# Altium footprint library XU-GENARAL PCB .PcbLib: 1176 footprints (part 71 of 75)
Each footprint in its own frame and in the unit in brackets; x right, y up, seen from the top. Pads: shape width x height; smd on the part's side, far side on the other; paste and mask are expansions set on the pad; w line width, h text height; cw(c..) or ccw(c..) is an arc to the next point about the centre after c.
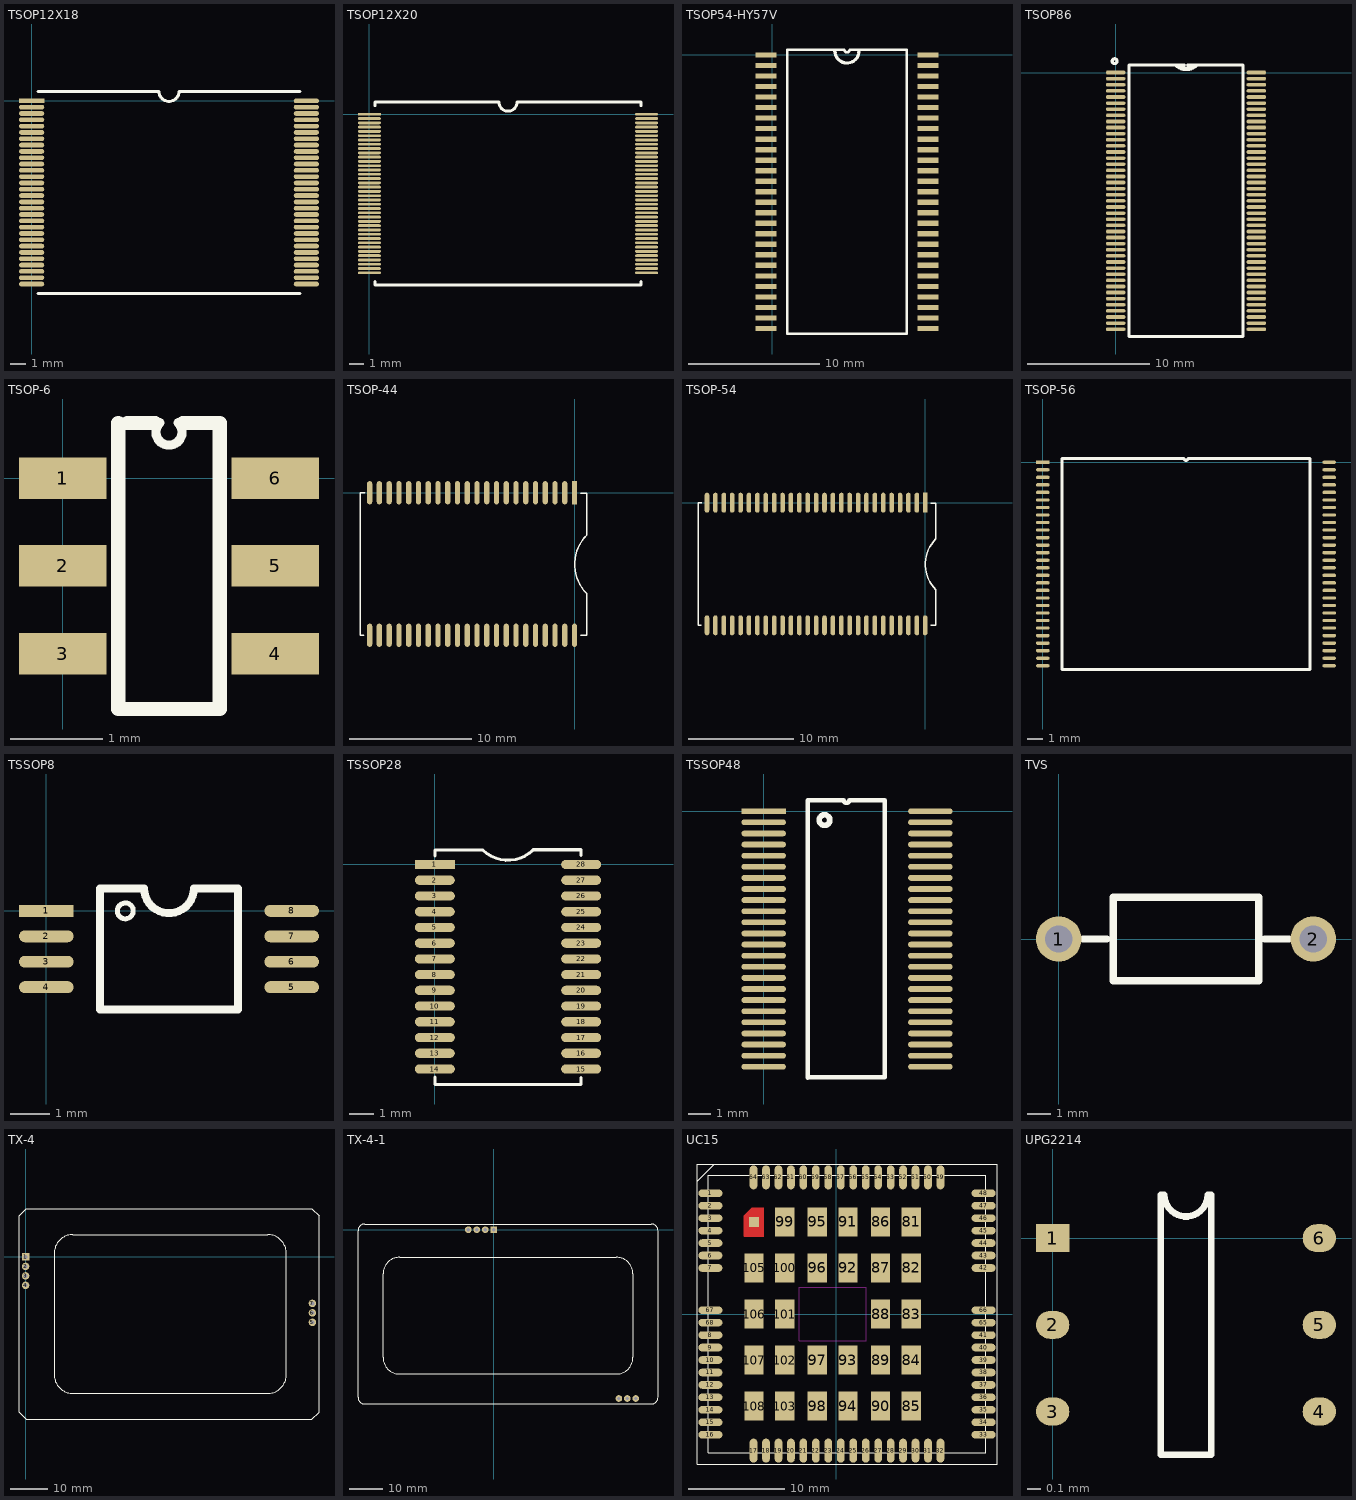
[diagram p70: the footprints below, top view; thin cyan lines are the x and y axes]

## TSOP12X18 [mm]
pads (60):
  rect 1.6x0.3 smd: 1(0,0)
  oval 1.6x0.3 smd: 2(0,-0.4) 3(0,-0.8) 4(0,-1.2) 5(0,-1.6) 6(0,-2) 7(0,-2.4) 8(0,-2.8) 9(0,-3.2) 10(0,-3.6) 11(0,-4) 12(0,-4.4) 13(0,-4.8) 14(0,-5.2) 15(0,-5.6) 16(0,-6) 17(0,-6.4) 18(0,-6.8) 19(0,-7.2) 20(0,-7.6) 21(0,-8) 22(0,-8.4) 23(0,-8.8) 24(0,-9.2) 25(0,-9.6) 26(0,-10) 27(0,-10.4) 28(0,-10.8) 29(0,-11.2) 30(0,-11.6) 31(17.4,-11.6) 32(17.4,-11.2) 33(17.4,-10.8) 34(17.4,-10.4) 35(17.4,-10) 36(17.4,-9.6) 37(17.4,-9.2) 38(17.4,-8.8) 39(17.4,-8.4) 40(17.4,-8) 41(17.4,-7.6) 42(17.4,-7.2) 43(17.4,-6.8) 44(17.4,-6.4) 45(17.4,-6) 46(17.4,-5.6) 47(17.4,-5.2) 48(17.4,-4.8) 49(17.4,-4.4) 50(17.4,-4) 51(17.4,-3.6) 52(17.4,-3.2) 53(17.4,-2.8) 54(17.4,-2.4) 55(17.4,-2) 56(17.4,-1.6) 57(17.4,-1.2) 58(17.4,-0.8) 59(17.4,-0.4) 60(17.4,0)
Top Overlay:
  lines w0.2: 0.4,-12.2 17,-12.2 ; 0.4,0.6 8.065,0.6 ccw(c8.7,0.6) 9.335,0.6 17,0.6

## TSOP12X20 [mm]
pads (76):
  rect 1.6x0.2 smd: 1(0,0)
  oval 1.6x0.2 smd: 2(0,-0.3) 3(0,-0.6) 4(0,-0.9) 5(0,-1.2) 6(0,-1.5) 7(0,-1.8) 8(0,-2.1) 9(0,-2.4) 10(0,-2.7) 11(0,-3) 12(0,-3.3) 13(0,-3.6) 14(0,-3.9) 15(0,-4.2) 16(0,-4.5) 17(0,-4.8) 18(0,-5.1) 19(0,-5.4) 20(0,-5.7) 21(0,-6) 22(0,-6.3) 23(0,-6.6) 24(0,-6.9) 25(0,-7.2) 26(0,-7.5) 27(0,-7.8) 28(0,-8.1) 29(0,-8.4) 30(0,-8.7) 31(0,-9) 32(0,-9.3) 33(0,-9.6) 34(0,-9.9) 35(0,-10.2) 36(0,-10.5) 37(0,-10.8) 38(0,-11.1) 39(19.4,-11.1) 40(19.4,-10.8) 41(19.4,-10.5) 42(19.4,-10.2) 43(19.4,-9.9) 44(19.4,-9.6) 45(19.4,-9.3) 46(19.4,-9) 47(19.4,-8.7) 48(19.4,-8.4) 49(19.4,-8.1) 50(19.4,-7.8) 51(19.4,-7.5) 52(19.4,-7.2) 53(19.4,-6.9) 54(19.4,-6.6) 55(19.4,-6.3) 56(19.4,-6) 57(19.4,-5.7) 58(19.4,-5.4) 59(19.4,-5.1) 60(19.4,-4.8) 61(19.4,-4.5) 62(19.4,-4.2) 63(19.4,-3.9) 64(19.4,-3.6) 65(19.4,-3.3) 66(19.4,-3) 67(19.4,-2.7) 68(19.4,-2.4) 69(19.4,-2.1) 70(19.4,-1.8) 71(19.4,-1.5) 72(19.4,-1.2) 73(19.4,-0.9) 74(19.4,-0.6) 75(19.4,-0.3) 76(19.4,0)
Top Overlay:
  lines w0.2: 0.4,-11.7 0.4,-11.95 19,-11.95 19,-11.7 ; 0.4,0.6 0.4,0.85 9.065,0.85 ccw(c9.7,0.85) 10.335,0.85 19,0.85 19,0.6

## TSOP54-HY57V [mm]
pads (54):
  rect 1.597x0.4 smd: 1(-0.5,0) 2(-0.5,-0.8) 3(-0.5,-1.6) 4(-0.5,-2.4) 5(-0.5,-3.2) 6(-0.5,-4) 7(-0.5,-4.8) 8(-0.5,-5.6) 9(-0.5,-6.4) 10(-0.5,-7.2) 11(-0.5,-8) 12(-0.5,-8.8) 13(-0.5,-9.6) 14(-0.5,-10.4) 15(-0.5,-11.2) 16(-0.5,-12) 17(-0.5,-12.8) 18(-0.5,-13.6) 19(-0.5,-14.4) 20(-0.5,-15.2) 21(-0.5,-16) 22(-0.5,-16.8) 23(-0.5,-17.6) 24(-0.5,-18.4) 25(-0.5,-19.2) 26(-0.5,-20) 27(-0.5,-20.8) 28(11.841,-20.8) 29(11.841,-20) 30(11.841,-19.2) 31(11.841,-18.4) 32(11.841,-17.6) 33(11.841,-16.8) 34(11.841,-16) 35(11.841,-15.2) 36(11.841,-14.4) 37(11.841,-13.6) 38(11.841,-12.8) 39(11.841,-12) 40(11.841,-11.2) 41(11.841,-10.4) 42(11.841,-9.6) 43(11.841,-8.8) 44(11.841,-8) 45(11.841,-7.2) 46(11.841,-6.4) 47(11.841,-5.6) 48(11.841,-4.8) 49(11.841,-4) 50(11.841,-3.2) 51(11.841,-2.4) 52(11.841,-1.6) 53(11.841,-0.8) 54(11.841,0)
Top Overlay:
  lines w0.2: 1.133,-21.2 10.208,-21.2 10.208,0.4 5.87,0.4 cw(c5.67,0.4) 5.47,0.4 1.133,0.4 1.133,-21.2
  lines w0.254: 4.752,0.299 ccw(c5.666,0.299) 6.579,0.356

## TSOP86 [mm]
pads (86):
  oct 1.6x0.3 smd: 1(0,0) 2(0,-0.5) 3(0,-1) 4(0,-1.5) 5(0,-2) 6(0,-2.5) 7(0,-3) 8(0,-3.5) 9(0,-4) 10(0,-4.5) 11(0,-5) 12(0,-5.5) 13(0,-6) 14(0,-6.5) 15(0,-7) 16(0,-7.5) 17(0,-8) 18(0,-8.5) 19(0,-9) 20(0,-9.5) 21(0,-10) 22(0,-10.5) 23(0,-11) 24(0,-11.5) 25(0,-12) 26(0,-12.5) 27(0,-13) 28(0,-13.5) 29(0,-14) 30(0,-14.5) 31(0,-15) 32(0,-15.5) 33(0,-16) 34(0,-16.5) 35(0,-17) 36(0,-17.5) 37(0,-18) 38(0,-18.5) 39(0,-19) 40(0,-19.5) 41(0,-20) 42(0,-20.5) 43(0,-21) 44(11.5,-21) 45(11.5,-20.5) 46(11.5,-20) 47(11.5,-19.5) 48(11.5,-19) 49(11.5,-18.5) 50(11.5,-18) 51(11.5,-17.5) 52(11.5,-17) 53(11.5,-16.5) 54(11.5,-16) 55(11.5,-15.5) 56(11.5,-15) 57(11.5,-14.5) 58(11.5,-14) 59(11.5,-13.5) 60(11.5,-13) 61(11.5,-12.5) 62(11.5,-12) 63(11.5,-11.5) 64(11.5,-11) 65(11.5,-10.5) 66(11.5,-10) 67(11.5,-9.5) 68(11.5,-9) 69(11.5,-8.5) 70(11.5,-8) 71(11.5,-7.5) 72(11.5,-7) 73(11.5,-6.5) 74(11.5,-6) 75(11.5,-5.5) 76(11.5,-5) 77(11.5,-4.5) 78(11.5,-4) 79(11.5,-3.5) 80(11.5,-3) 81(11.5,-2.5) 82(11.5,-2) 83(11.5,-1.5) 84(11.5,-1) 85(11.5,-0.5) 86(11.5,0)
Top Overlay:
  circle w0.25: c-0.092,0.93 r0.2
  lines w0.25: 5.625,0.6 1.1,0.6 1.1,-21.6 10.4,-21.6 10.4,0.6 5.875,0.6
  lines w0.254: 4.885,0.6 ccw(c5.773,1.488) 6.66,0.6 ; 5.16,0.6 ccw(c5.748,1.188) 6.335,0.6

## TSOP-6 [mm]
pads (6):
  rect 0.95x0.45 smd: 1(0,0) 2(0,-0.95) 3(0,-1.9) 4(2.3,-1.9) 5(2.3,-0.95) 6(2.3,0)
Top Overlay:
  lines w0.1: 1.05,0.6 ccw(c1.15,0.5) 1.25,0.6
  lines w0.152: 0.6,0.6 0.6,-2.5 1.7,-2.5 1.7,0.6 1.3,0.6 ; 0.7,0.6 1,0.6

## TSOP-44 [mil]
pads (44):
  rect 17x75 smd: 1(0,0)
  oval 17x75 smd: 2(-31.5,0) 3(-62.99,0) 4(-94.49,0) 5(-125.98,0) 6(-157.48,0) 7(-188.98,0) 8(-220.47,0) 9(-251.97,0) 10(-283.46,0) 11(-314.99,0) 12(-346.46,0) 13(-377.95,0) 14(-409.45,0) 15(-440.94,0) 16(-472.44,0) 17(-503.94,0) 18(-535.43,0) 19(-566.93,0) 20(-598.43,0) 21(-629.92,0) 22(-661.42,0) 23(-661.42,-460) 24(-630,-460) 25(-598.43,-460) 26(-566.93,-460) 27(-535.43,-460) 28(-503.94,-460) 29(-472.44,-460) 30(-440.94,-460) 31(-409.45,-460) 32(-377.95,-460) 33(-346.46,-460) 34(-314.99,-460) 35(-283.46,-460) 36(-251.97,-460) 37(-220.47,-460) 38(-188.98,-460) 39(-157.48,-460) 40(-125.98,-460) 41(-94.49,-460) 42(-62.99,-460) 43(-31.5,-460) 44(0,-460)
Top Overlay:
  lines w5: -680,-460 -692,-460 -692,0 -678,0 ; 20,-460 40,-460 40,-326 cw(c135,-231) 40,-136 40,-2 20,-2

## TSOP-54 [mil]
height 43.31
pads (54):
  rect 17x75 smd: 1(-0.01,-0.03)
  oval 17x75 smd: 2(-31.5,-0.03) 3(-63,-0.03) 4(-94.5,-0.03) 5(-125.99,-0.03) 6(-157.49,-0.03) 7(-188.98,-0.03) 8(-220.48,-0.03) 9(-251.98,-0.03) 10(-283.47,-0.03) 11(-315,-0.03) 12(-346.46,-0.03) 13(-377.96,-0.03) 14(-409.46,-0.03) 15(-440.95,-0.03) 16(-472.45,-0.03) 17(-503.94,-0.03) 18(-535.44,-0.03) 19(-566.94,-0.03) 20(-598.43,-0.03) 21(-629.93,-0.03) 22(-661.43,-0.03) 23(-692.92,-0.03) 24(-724.42,-0.03) 25(-755.91,-0.03) 26(-787.41,-0.03) 27(-818.91,-0.03) 28(-818.91,-460.03) 29(-787.41,-460.03) 30(-755.91,-460.03) 31(-724.42,-460.03) 32(-692.92,-460.03) 33(-661.43,-460.03) 34(-630.01,-460.03) 35(-598.43,-460.03) 36(-566.94,-460.03) 37(-535.44,-460.03) 38(-503.94,-460.03) 39(-472.45,-460.03) 40(-440.95,-460.03) 41(-409.46,-460.03) 42(-377.96,-460.03) 43(-346.46,-460.03) 44(-315,-460.03) 45(-283.47,-460.03) 46(-251.98,-460.03) 47(-220.48,-460.03) 48(-188.98,-460.03) 49(-157.49,-460.03) 50(-125.99,-460.03) 51(-94.5,-460.03) 52(-63,-460.03) 53(-31.5,-460.03) 54(-0.01,-460.03)
Top Overlay:
  lines w5: -840.01,-460.03 -852.01,-460.03 -852.01,-0.03 -838.01,-0.03 ; 19.99,-460.03 39.99,-460.03 39.99,-326.03 cw(c134.99,-231.03) 39.99,-136.03 39.99,-2.03 19.99,-2.03

## TSOP-56 [mm]
pads (56):
  rect 0.9x0.22 smd: 1(0,0)
  oval 0.9x0.22 smd: 2(0,-0.5) 3(0,-1) 4(0,-1.5) 5(0,-2) 6(0,-2.5) 7(0,-3) 8(0,-3.5) 9(0,-4) 10(0,-4.5) 11(0,-5) 12(0,-5.5) 13(0,-6) 14(0,-6.5) 15(0,-7) 16(0,-7.5) 17(0,-8) 18(0,-8.5) 19(0,-9) 20(0,-9.5) 21(0,-10) 22(0,-10.5) 23(0,-11) 24(0,-11.5) 25(0,-12) 26(0,-12.5) 27(0,-13) 28(0,-13.5) 29(19,-13.5) 30(19,-13) 31(19,-12.5) 32(19,-12) 33(19,-11.5) 34(19,-11) 35(19,-10.5) 36(19,-10) 37(19,-9.5) 38(19,-9) 39(19,-8.5) 40(19,-8) 41(19,-7.5) 42(19,-7) 43(19,-6.5) 44(19,-6) 45(19,-5.5) 46(19,-5) 47(19,-4.5) 48(19,-4) 49(19,-3.5) 50(19,-3) 51(19,-2.5) 52(19,-2) 53(19,-1.5) 54(19,-1) 55(19,-0.5) 56(19,0)
Top Overlay:
  lines w0.2: 1.285,-13.75 17.715,-13.75 17.715,0.25 9.625,0.25 cw(c9.5,0.25) 9.375,0.25 1.285,0.25 1.285,-13.75

## TSSOP8 [mil]
pads (8):
  rect 55x12 smd: 1(0,0)
  oval 55x12 smd: 2(0,-25.59) 3(0,-51.18) 4(0,-76.77) 5(246.97,-76.77) 6(246.97,-51.18) 7(246.97,-25.59) 8(246.97,0)
Top Overlay:
  circle w5: c79.5,0 r8
  lines w7.87: 97.5,22.64 54,22.64 54,-99.41 192.97,-99.41 192.97,22.64 149.5,22.64 ; 98.48,22.64 ccw(c123.48,22.64) 148.48,22.64

## TSSOP28 [mil]
pads (28):
  rect 65x15 smd: 1(-0.01,-0.03)
  oval 65x15 smd: 2(-0.01,-25.62) 3(-0.01,-51.21) 4(-0.01,-76.8) 5(-0.01,-102.39) 6(-0.01,-127.98) 7(-0.01,-153.57) 8(-0.01,-179.17) 9(-0.01,-204.76) 10(-0.01,-230.35) 11(-0.01,-255.94) 12(-0.01,-281.53) 13(-0.01,-307.12) 14(-0.01,-332.71) 15(237.99,-332.71) 16(237.99,-307.12) 17(237.99,-281.53) 18(237.99,-255.94) 19(237.99,-230.35) 20(237.99,-204.76) 21(237.99,-179.17) 22(237.99,-153.57) 23(237.99,-127.98) 24(237.99,-102.39) 25(237.99,-76.8) 26(237.99,-51.21) 27(237.99,-25.62) 28(237.99,-0.03)
Top Overlay:
  lines w5: -0.01,-358.03 237.99,-358.03 237.99,-346.72 ; -0.01,-357.34 -0.01,-346.03 ; -0.01,13.97 -0.01,23.51 77.99,23.51 ccw(c118.76,64.74) 159.99,23.97 237.99,23.97 237.99,14.66

## TSSOP48 [mm]
pads (48):
  rect 2x0.26 smd: 1(0,0)
  oval 2x0.26 smd: 2(0,-0.5) 3(0,-1) 4(0,-1.5) 5(0,-2) 6(0,-2.5) 7(0,-3) 8(0,-3.5) 9(0,-4) 10(0,-4.5) 11(0,-5) 12(0,-5.5) 13(0,-6) 14(0,-6.5) 15(0,-7) 16(0,-7.5) 17(0,-8) 18(0,-8.5) 19(0,-9) 20(0,-9.5) 21(0,-10) 22(0,-10.5) 23(0,-11) 24(0,-11.5) 25(7.5,-11.5) 26(7.5,-11) 27(7.5,-10.5) 28(7.5,-10) 29(7.5,-9.5) 30(7.5,-9) 31(7.5,-8.5) 32(7.5,-8) 33(7.5,-7.5) 34(7.5,-7) 35(7.5,-6.5) 36(7.5,-6) 37(7.5,-5.5) 38(7.5,-5) 39(7.5,-4.5) 40(7.5,-4) 41(7.5,-3.5) 42(7.5,-3) 43(7.5,-2.5) 44(7.5,-2) 45(7.5,-1.5) 46(7.5,-1) 47(7.5,-0.5) 48(7.5,0)
Top Overlay:
  circle w0.254: c2.739,-0.4 r0.239
  lines w0.2: 2.01,0.5 3.6,0.5 ccw(c3.725,0.5) 3.85,0.5 5.44,0.5
  lines w0.203: 1.975,-12 1.975,0.5 ; 2.01,-11.965 5.44,-11.965 5.44,0.5

## TVS [mil]
pads (2):
  round 75 hole 45: 1(0,0) 2(420,0)
Top Overlay:
  lines w12: 40,0 79.37,0 ; 340,0 379.37,0 ; 90,-68.9 330,-68.9 330,68.9 90,68.9 90,-68.9

## TX-4 [mm]
pads (7):
  rect 2x2 hole 1.016: 1(0,0)
  round 2 hole 1.016: 2(0,-2.54) 3(0,-5.08) 4(0,-7.62) 5(77,-17.54) 6(77,-15) 7(77,-12.46)
Top Overlay:
  lines w0.254: 7.685,-31.62 ccw(c12.685,-31.62) 12.685,-36.62 65,-36.62 ccw(c65,-31.62) 70,-31.62 70,1 ccw(c65,1) 65,6 12.685,6 ccw(c12.685,1) 7.685,1 7.689,-31.624 ; -1.768,-41.62 0.232,-43.62 76.768,-43.62 78.768,-41.62 78.768,11 76.768,13 0.232,13 -1.768,11 -1.768,-41.62
Bottom Overlay:
  lines w0.254: -1.27,-1.27 1.27,-1.27 ; -1.27,-8.89 -1.27,0.635 -0.635,1.27 1.27,1.27 1.27,-8.89 -1.27,-8.89 ; 75.73,-18.81 75.73,-11.19 78.27,-11.19 78.27,-18.81 75.73,-18.81

## TX-4-1 [mm]
pads (7):
  rect 2x2 hole 1.016: 1(0,0)
  round 2 hole 1.016: 2(-2.54,0) 3(-5.08,0) 4(-7.62,0) 5(42.621,-50.648) 6(40.081,-50.648) 7(37.541,-50.648)
Top Overlay:
  lines w0.254: -28.716,-43.299 36.784,-43.299 ccw(c36.784,-38.299) 41.784,-38.299 41.784,-13.299 ccw(c36.784,-13.299) 36.784,-8.299 -28.216,-8.299 ccw(c-28.216,-13.299) -33.216,-13.299 -33.216,-38.299 ccw(c-28.216,-38.299) -28.216,-43.299 ; -40.716,-50.299 ccw(c-38.716,-50.299) -38.716,-52.299 47.284,-52.299 ccw(c47.284,-50.299) 49.284,-50.299 49.284,-0.299 ccw(c47.284,-0.299) 47.284,1.701 -38.716,1.701 ccw(c-38.716,-0.299) -40.716,-0.299 -40.716,-50.299
Bottom Overlay:
  lines w0.254: -1.27,-1.27 -1.27,1.27 ; -8.89,-1.27 -8.89,1.27 0.635,1.27 1.27,0.635 1.27,-1.27 -8.89,-1.27 ; 36.271,-51.918 36.271,-49.378 43.891,-49.378 43.891,-51.918 36.271,-51.918

## UC15 [mm]
pads (108):
  oval 2.5x0.8 smd: 1(-13.107,12.6) 2(-13.107,11.3) 3(-13.107,10) 4(-13.107,8.7) 5(-13.107,7.4) 6(-13.107,6.1) 7(-13.107,4.8) 8(-13.107,-2.2) 9(-13.107,-3.5) 10(-13.107,-4.8) 11(-13.107,-6.1) 12(-13.107,-7.4) 13(-13.107,-8.7) 14(-13.107,-10) 15(-13.107,-11.3) 16(-13.107,-12.6) 33(15.393,-12.6) 34(15.393,-11.3) 35(15.393,-10) 36(15.393,-8.7) 37(15.393,-7.4) 38(15.393,-6.1) 39(15.393,-4.8) 40(15.393,-3.5) 41(15.393,-2.2) 42(15.393,4.8) 43(15.393,6.1) 44(15.393,7.4) 45(15.393,8.7) 46(15.393,10) 47(15.393,11.3) 48(15.393,12.6) 65(15.393,-0.9) 66(15.393,0.4) 67(-13.107,0.4) 68(-13.107,-0.9)
  oval 0.8x2.5 smd: 17(-8.607,-14.25) 18(-7.307,-14.25) 19(-6.007,-14.25) 20(-4.707,-14.25) 21(-3.407,-14.25) 22(-2.107,-14.25) 23(-0.807,-14.25) 24(0.493,-14.25) 25(1.793,-14.25) 26(3.093,-14.25) 27(4.393,-14.25) 28(5.693,-14.25) 29(6.993,-14.25) 30(8.293,-14.25) 31(9.593,-14.25) 32(10.893,-14.25) 49(10.893,14.25) 50(9.593,14.25) 51(8.293,14.25) 52(6.993,14.25) 53(5.693,14.25) 54(4.393,14.25) 55(3.093,14.25) 56(1.793,14.25) 57(0.493,14.25) 58(-0.807,14.25) 59(-2.107,14.25) 60(-3.407,14.25) 61(-4.707,14.25) 62(-6.007,14.25) 63(-7.307,14.25) 64(-8.607,14.25)
  rect 0x0 smd: 69(2.043,1.6) 70(2.043,0) 71(2.043,-1.6) 72(0.443,1.6) 73(0.443,0) 74(0.443,-1.6) 75(-1.157,1.6) 76(-1.157,0) 77(-1.157,-1.6) 78(-2.757,1.6) 79(-2.757,0) 80(-2.757,-1.6)
  rect 2x3 smd: 81(7.843,9.6) 82(7.843,4.8) 83(7.843,0) 84(7.843,-4.8) 85(7.843,-9.6) 86(4.643,9.6) 87(4.643,4.8) 88(4.643,0) 89(4.643,-4.8) 90(4.643,-9.6) 91(1.243,9.6) 92(1.243,4.8) 93(1.243,-4.8) 94(1.243,-9.6) 95(-1.957,9.6) 96(-1.957,4.8) 97(-1.957,-4.8) 98(-1.957,-9.6) 99(-5.357,9.6) 100(-5.357,4.8) 101(-5.357,0) 102(-5.357,-4.8) 103(-5.357,-9.6) 105(-8.557,4.8) 106(-8.557,0) 107(-8.557,-4.8) 108(-8.557,-9.6)
  rect 1x1 smd: 104(-8.557,9.6)
Top Layer:
  region: -9.096,9.801 -8.268,10.63 -8.738,11.1 -9.566,10.271
  region: -9.55,10.262 -9.55,8.128 -8.661,8.128 -8.661,10.262
  region: -8.738,11.074 -8.738,8.103 -7.569,8.103 -7.569,11.074
  lines w0.102: -9.557,8.1 -7.557,8.1 -7.557,11.1 -8.732,11.1 -9.557,10.275 -9.557,8.1
Top Overlay:
  lines w0.1: -14.507,-15.65 -14.507,15.65 16.793,15.65 16.793,-15.65 -14.507,-15.65 ; -14.507,13.865 -14.507,15.625 -12.722,15.625 -14.507,13.865 ; -13.357,-14.5 15.643,-14.5 15.643,14.5 -13.357,14.5 -13.357,-14.5
Top Paste:
  region: -9.097,9.8 -8.268,10.63 -8.742,11.104 -9.572,10.274
  region: -9.525,10.262 -9.525,8.103 -8.687,8.103 -8.687,10.262
  region: -8.738,11.074 -8.738,8.103 -7.595,8.103 -7.595,11.074
  lines w0.102: -9.557,8.1 -7.557,8.1 -7.557,11.1 -8.732,11.1 -9.557,10.275 -9.557,8.1
Top Solder:
  region: -8.814,11.125 -8.814,8.077 -7.544,8.077 -7.544,11.125
  region: -9.601,10.338 -9.601,8.077 -8.788,8.077 -8.788,10.338
  region: -9.18,9.921 -8.395,10.706 -8.812,11.123 -9.597,10.338
  lines w0.102: -9.607,8.05 -7.507,8.05 -7.507,11.15 -8.782,11.15 -9.607,10.325 -9.607,8.05
Keep-Out Layer:
  lines w0.102: -3.857,-2.8 3.143,-2.8 3.143,2.8 -3.857,2.8 -3.857,-2.8
Mechanical 1:
  text "Area" at -1.803,-1.397 h0.8
  text "Keepout" at -2.769,0.889 h0.8

## UPG2214 [mm]
pads (6):
  rect 0.25x0.21 smd: 1(0,0)
  oval 0.25x0.21 smd: 2(0,-0.65) 3(0,-1.3) 4(2,-1.3) 5(2,-0.65) 6(2,0)
Top Overlay:
  lines w0.05: 0.81,-1.625 0.81,0.325 0.838,0.325 ccw(c1,0.325) 1.162,0.325 1.19,0.325 1.19,-1.625 0.81,-1.625